# Altium footprint library Passive Pad Lib.PcbLib: 110 footprints (part 6 of 7)
Each footprint in its own frame and in the unit in brackets; x right, y up, seen from the top. Pads: shape width x height; smd on the part's side, far side on the other; paste and mask are expansions set on the pad; w line width, h text height; cw(c..) or ccw(c..) is an arc to the next point about the centre after c.
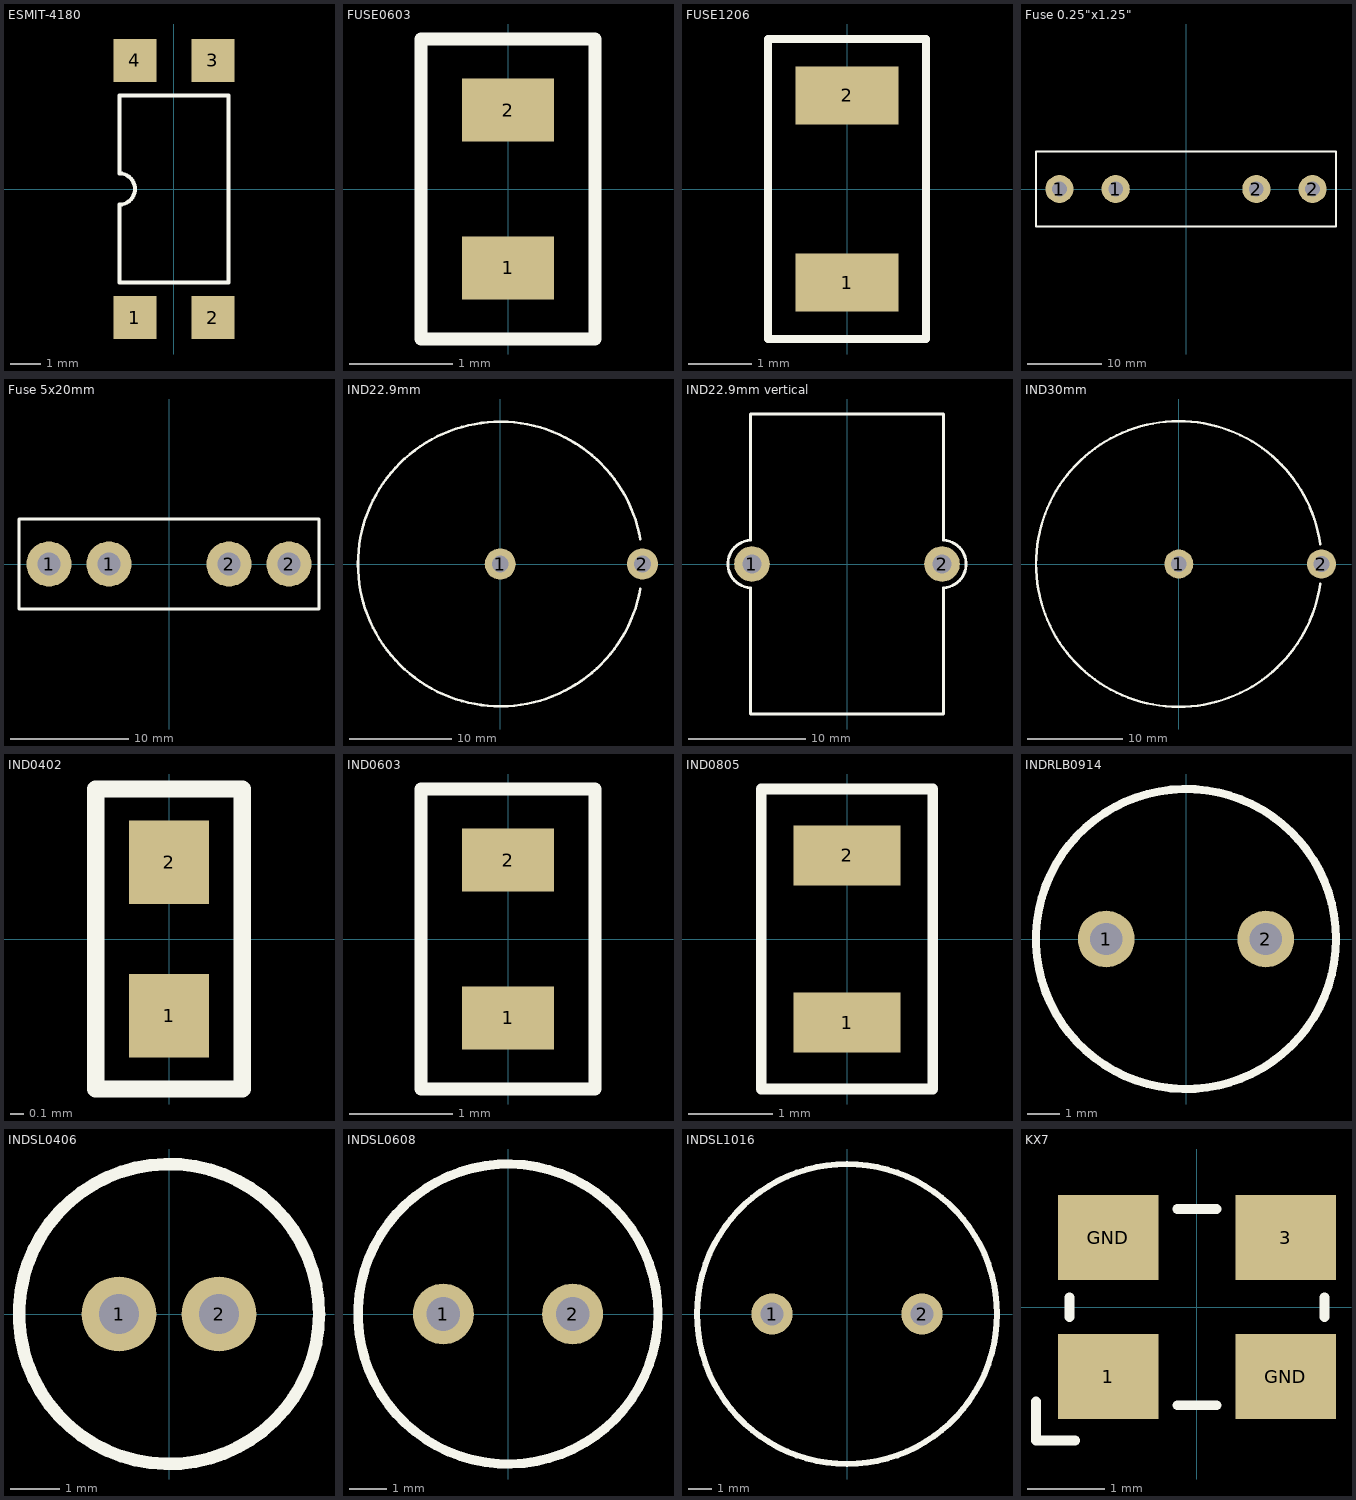
[diagram p5: the footprints below, top view; thin cyan lines are the x and y axes]

## ESMIT-4180 [mil] "SMD Pulse Transformer ESMIT-4180"
pads (4):
  rect 55x55 smd: 1(-50,-165) 2(50,-165) 3(50,165) 4(-50,165)
Top Overlay:
  lines w5: -70,-120 70,-120 70,120 -70,120 -70,20 cw(c-70,0) -70,-20 -70,-120
3D body: height 171, standoff -22, extent 48,0 48,0
3D body: height 171, standoff -22, extent 48,0 48,0
3D body "ESMIT-4180.STEP": height 141.8, standoff 0.06, extent -102.36,-181.1 102.36,181.1

## FUSE0603 [mil] "0603 Reflow Pad"
pads (2):
  rect 35x24 smd: 1(0,-30) 2(0,30)
Top Overlay:
  lines w5: -33,-57 33,-57 33,57 -33,57 -33,-57
3D body "SMD Fuse 0603.STEP": height 17.8, standoff 0, extent -15.75,-31.49 15.75,31.51

## FUSE1206 [mil] "1206 Reflow Pad"
pads (2):
  rect 64x36 smd: 1(0,-58) 2(0,58)
Top Overlay:
  lines w5: -49,-93 -49,93 49,93 49,-93 -49,-93
3D body "SMD Fuse 1206.STEP": height 21.73, standoff 0, extent -31.5,-61.02 31.49,61.03

## Fuse 0.25"x1.25" [mil] "Fuse 0.25\"X1.25\" (6.35X31.75mm) with Clip"
pads (4):
  round 150 hole 78: 1(-675,0) 1(-375,0) 2(375,0) 2(675,0)
Top Overlay:
  lines w10: -800,-200 800,-200 800,200 -800,200 -800,-200
3D body "Fuse 6.3x32 with LF-102071.STEP": height 428.79, standoff -141.73, extent -692.92,-155.5 692.91,155.52

## Fuse 5x20mm [mil] "Fuse 5X20mm with Clip KLS5-001 (KLS)"
pads (4):
  round 150 hole 78: 1(-400,0) 1(-200,0) 2(200,0) 2(400,0)
Top Overlay:
  lines w10: -500,-150 500,-150 500,150 -500,150 -500,-150
3D body "Fuse 5x20 with KLS5-001.STEP": height 393.29, standoff -137.8, extent -409.46,-137.79 409.44,137.8

## IND22.9mm [mil] "Power Toroidal Inductor  (Size:22.9X14mm)"
pads (2):
  round 120 hole 65: 1(0,0) 2(550,0)
Top Overlay:
  lines w10: 541.64,-95.51 cw(c0,0) 541.64,95.51
3D body "DT90-52B.STEP": height 575.59, standoff -93.7, extent -505.91,-505.91 577.56,505.9

## IND22.9mm vertical [mil] "Power Toroidal Inductor  (Size:22.9X14mm)"
height 1500
pads (2):
  round 120 hole 65: 1(-320,0) 2(320,0)
Top Overlay:
  lines w10: -325.19,-80 cw(c-321,0) -325.19,80 ; -325,-80 -325,-505 325,-505 325,-80 ; -325,80 -325,505 325,505 325,80 ; 325.19,-80 ccw(c321,0) 325.19,80
3D body "DT90-52B_Vertical.STEP": height 1017.72, standoff -196.85, extent -346.45,-507.87 346.46,507.88

## IND30mm [mil] "Power Toroidal Inductor  (Size:30X14mm)"
pads (2):
  round 120 hole 65: 1(0,0) 2(590,0)
Top Overlay:
  lines w10: 584.8,-82.19 cw(c0,0) 584.8,82.19
3D body "KNF1060-26A.STEP": height 575.59, standoff -93.7, extent -584.65,-584.65 617.56,584.64

## IND0402 [mil] "0402 Reflow Pad"
pads (2):
  rect 23x24 smd: 1(0,-22) 2(0,22)
Top Overlay:
  lines w5: -21,-43 21,-43 21,43 -21,43 -21,-43
3D body "SMD Inductor 0402.STEP": height 19.76, standoff 0, extent -9.84,-19.69 9.84,19.69

## IND0603 [mil] "0603 Reflow Pad"
pads (2):
  rect 35x24 smd: 1(0,-30) 2(0,30)
Top Overlay:
  lines w5: -33,-57 -33,57 33,57 33,-57 -33,-57
3D body "SMD Inductor 0603.STEP": height 35.51, standoff 0, extent -15.75,-31.5 15.75,31.5

## IND0805 [mil] "0805 Reflow Pad"
pads (2):
  rect 50x28 smd: 1(0,-39) 2(0,39)
Top Overlay:
  lines w5: -40,-70 40,-70 40,70 -40,70 -40,-70
3D body "SMD Inductor 0805.STEP": height 49.29, standoff 0, extent -24.61,-39.37 24.6,39.37

## INDRLB0914 [mil]
pads (2):
  round 70 hole 40: 1(-98.43,0) 2(98.43,0)
Top Overlay:
  circle w10: c0,0 r185
3D body "THD Inductor RLB0914.STEP": height 511.81, standoff -196.85, extent -181.09,-181.09 181.11,181.11

## INDSL0406 [mil] "Power Inductor Case SL0406 (Size:6X9mm,Straight)"
pads (2):
  round 60 hole 32: 1(-40,0) 2(40,0)
Top Overlay:
  circle w10: c0,0 r120
3D body "THD Inductor SL0406.STEP": height 379.33, standoff -171.85, extent -118.11,-118.11 118.11,118.11

## INDSL0608 [mil] "Power Inductor Case SL0608 (Size:8X12mm,Straight)"
pads (2):
  round 65 hole 36: 1(-69,0) 2(69,0)
Top Overlay:
  circle w10: c0,0 r160
3D body "THD Inductor SL0608.STEP": height 497.44, standoff -171.85, extent -157.48,-157.48 157.48,157.48

## INDSL1016 [mil] "Power Inductor Case SL1016 (Size:13X18mm,Straight)"
pads (2):
  round 70 hole 40: 1(-128,0) 2(128,0)
Top Overlay:
  circle w10: c0,0 r256
3D body "THD Inductor SL1016.STEP": height 773.03, standoff -171.85, extent -255.9,-255.9 255.91,255.91

## KX7 [mm]
height 0.8
pads (4):
  rect 1.3x1.1 smd: 1(-1.15,-0.9) 3(1.15,0.9) GND(-1.15,0.9) GND(1.15,-0.9)
Top Overlay:
  lines w0.127: -2.083,-1.219 -2.083,-1.727 -1.575,-1.727 ; -1.651,-0.127 -1.651,0.127 ; -0.254,-1.27 0.254,-1.27 ; -0.254,1.27 0.254,1.27 ; 1.651,-0.127 1.651,0.127